# Altium footprint library PcbLib1.PcbLib: 69 footprints (part 1 of 5)
Each footprint in its own frame and in the unit in brackets; x right, y up, seen from the top. Pads: shape width x height; smd on the part's side, far side on the other; paste and mask are expansions set on the pad; w line width, h text height; cw(c..) or ccw(c..) is an arc to the next point about the centre after c.
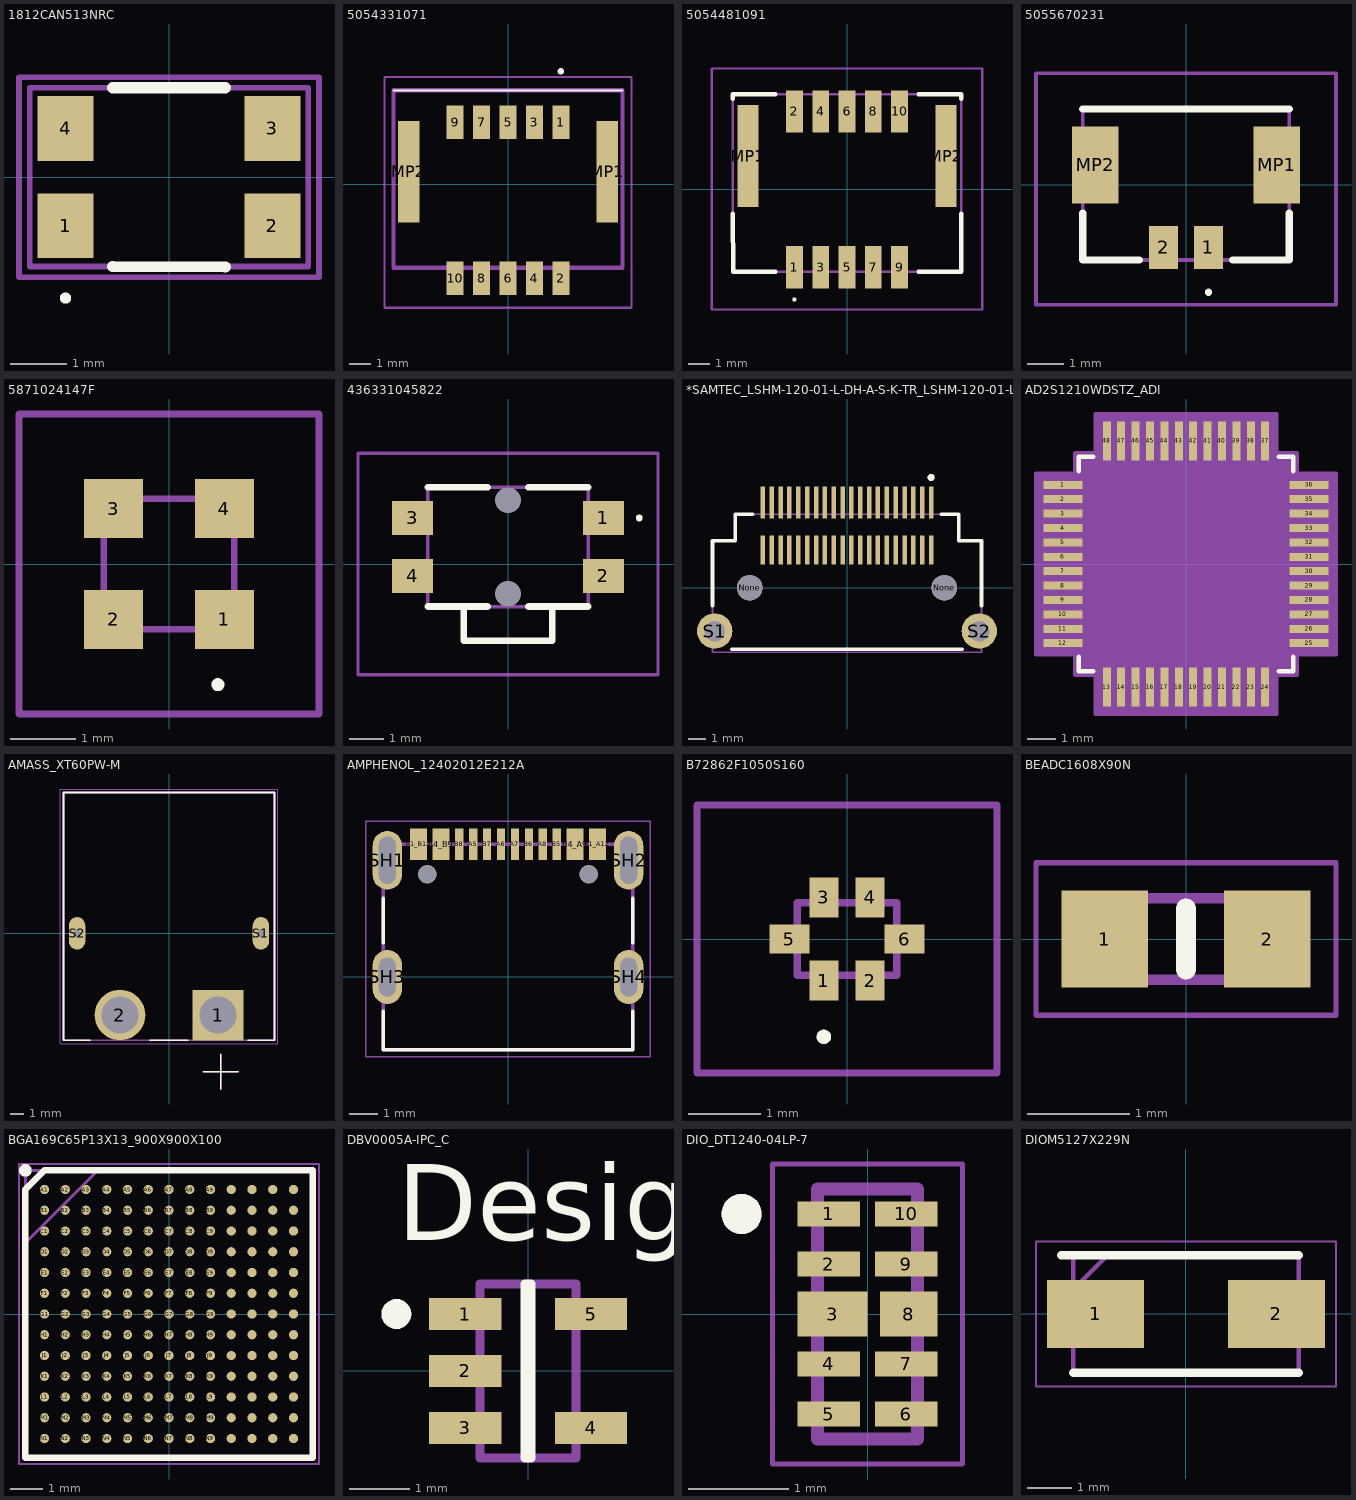
[diagram p0: the footprints below, top view; thin cyan lines are the x and y axes]

## 1812CAN513NRC [mm]
pads (4):
  rect 1x1.15 smd: 1(-1.84,-0.865) 2(1.84,-0.865) 3(1.84,0.865) 4(-1.84,0.865)
Top Overlay:
  lines w0.1: -1.84,-2.2 cw(c-1.84,-2.15) -1.84,-2.1 cw(c-1.84,-2.15) -1.84,-2.2
  lines w0.2: -1,-1.59 1,-1.6 ; -1,1.59 1,1.59
Mechanical 13:
  lines w0.1: -2.475,-1.59 -2.475,1.59 2.475,1.59 2.475,-1.59 -2.475,-1.59
Mechanical 15:
  lines w0.1: -2.667,-1.778 2.667,-1.778 2.667,1.778 -2.667,1.778 -2.667,-1.778
3D body "1812CAN-513NRC.stp": height 3.1, standoff 0, extent -2.475,-1.59 2.475,1.59

## 5054331071 [mm]
pads (12):
  rect 0.8x1.6 smd: 1(2.5,2.94) 2(2.5,-4.45) 3(1.25,2.94) 4(1.25,-4.45) 5(0,2.94) 6(0,-4.45) 7(-1.25,2.94) 8(-1.25,-4.45) 9(-2.5,2.94) 10(-2.5,-4.45)
  rect 1x4.8 smd: MP1(4.7,0.6) MP2(-4.7,0.6)
Top Overlay:
  lines w0.1: -5.425,4.45 5.425,4.45
  lines w0.2: 2.5,5.3 ccw(c2.5,5.35) 2.5,5.4 ; 2.5,5.3 cw(c2.5,5.35) 2.5,5.4 ; 2.5,5.3 ccw(c2.5,5.35) 2.5,5.4
Mechanical 13:
  lines w0.2: -5.425,-3.95 -5.425,4.45 5.425,4.45 5.425,-3.95 -5.425,-3.95
Mechanical 15:
  lines w0.1: -5.842,-5.842 -5.842,5.08 5.842,5.08 5.842,-5.842 -5.842,-5.842
3D body "505433-1071.stp": height 7.25, standoff 0, extent -5.425,-5.48 5.425,3.57

## 5054481091 [mm]
pads (12):
  rect 0.8x2 smd: 1(-2.5,-3.715) 2(-2.5,3.685) 3(-1.25,-3.715) 4(-1.25,3.685) 5(0,-3.715) 6(0,3.685) 7(1.25,-3.715) 8(1.25,3.685) 9(2.5,-3.715) 10(2.5,3.685)
  rect 1x4.85 smd: MP1(-4.7,1.56) MP2(4.7,1.56)
Top Overlay:
  lines w0.1: -2.5,-5.3 ccw(c-2.5,-5.25) -2.5,-5.2 ccw(c-2.5,-5.25) -2.5,-5.3
  lines w0.2: -5.425,-1.175 -5.4,-3.93 -3.4,-3.93 ; -5.425,4.285 -5.425,4.5 -3.4,4.5 ; 3.4,-3.93 5.425,-3.93 5.425,-1.175 ; 3.4,4.5 5.425,4.5 5.425,4.285
Mechanical 13:
  lines w0.1: -5.425,-3.93 5.425,-3.93 5.425,4.5 -5.425,4.5 -5.425,-3.93
Mechanical 15:
  lines w0.1: -6.425,-5.715 6.425,-5.715 6.425,5.715 -6.425,5.715 -6.425,-5.715
3D body "505448-1091.stp": height 8.95, standoff 0, extent -5.425,-4.45 5.425,4.45

## 5055670231 [mm]
pads (4):
  rect 0.8x1.2 smd: 1(0.625,-1.75) 2(-0.625,-1.75)
  rect 1.3x2.15 smd: MP1(2.525,0.545) MP2(-2.525,0.545)
Top Overlay:
  lines w0.1: 0.625,-3.05 ccw(c0.625,-3) 0.625,-2.95 ccw(c0.625,-3) 0.625,-3.05
  lines w0.2: -2.875,-0.8 -2.875,-2.1 -1.3,-2.1 ; -2.875,2.1 2.875,2.1 ; 1.3,-2.1 2.875,-2.1 2.875,-0.8
Mechanical 13:
  lines w0.1: -2.875,-2.1 2.875,-2.1 2.875,2.1 -2.875,2.1 -2.875,-2.1
Mechanical 15:
  lines w0.1: -4.175,-3.35 4.175,-3.35 4.175,3.1 -4.175,3.1 -4.175,-3.35
3D body "505567-0231.stp": height 4.2, standoff 0, extent -2.88,-2.07 2.87,1.83

## 5871024147F [mm]
pads (4):
  rect 0.9x0.9 smd: 1(0.85,-0.85) 2(-0.85,-0.85) 3(-0.85,0.85) 4(0.85,0.85)
Top Overlay:
  lines w0.1: 0.75,-1.9 cw(c0.75,-1.85) 0.75,-1.8 cw(c0.75,-1.85) 0.75,-1.9
Mechanical 13:
  lines w0.1: -1,-1 -1,1 1,1 1,-1 -1,-1
Mechanical 15:
  lines w0.1: -2.3,-2.3 -2.3,2.3 2.3,2.3 2.3,-2.3 -2.3,-2.3
3D body "587-1024-147F.stp": height 1, standoff 0, extent -1,-1 1,1

## 436331045822 [mm]
pads (6):
  rect 1.2x1 smd: 1(2.8,1.35) 2(2.8,-0.35) 3(-2.8,1.35) 4(-2.8,-0.35)
  round 0.375 hole 0.75 unplated: MH1(0,1.875) MH2(0,-0.875)
Top Overlay:
  lines w0.1: 3.8,1.35 cw(c3.85,1.35) 3.9,1.35 cw(c3.85,1.35) 3.8,1.35
  lines w0.2: -2.35,-1.25 -0.6,-1.25 ; -2.35,2.25 -0.6,2.25 ; -1.3,-1.25 -1.3,-2.25 1.3,-2.25 1.3,-1.25 ; 0.6,-1.25 2.35,-1.25 ; 0.6,2.25 2.35,2.25
Mechanical 13:
  lines w0.1: -1.3,-1.25 -1.3,-2.25 1.3,-2.25 1.3,-1.25 ; -2.35,-1.25 -2.35,2.25 2.35,2.25 2.35,-1.25 -2.35,-1.25
Mechanical 15:
  lines w0.1: -4.4,-3.25 -4.4,3.25 4.4,3.25 4.4,-3.25 -4.4,-3.25
3D body "436331045822.stp": height 2.15, standoff 0, extent -3.24,-1.4 3.16,3.1

## *SAMTEC_LSHM-120-01-L-DH-A-S-K-TR_LSHM-120-01-L-DH-A-S-K-TR(Primary) [mm]
pads (44):
  rect 0.254x1.8 smd: 01(4.75,4.81) 03(4.25,4.81) 05(3.75,4.81) 07(3.25,4.81) 09(2.75,4.81) 11(2.25,4.81) 13(1.75,4.81) 15(1.25,4.81) 17(0.75,4.81) 19(0.25,4.81) 21(-0.25,4.81) 23(-0.75,4.81) 25(-1.25,4.81) 27(-1.75,4.81) 29(-2.25,4.81) 31(-2.75,4.81) 33(-3.25,4.81) 35(-3.75,4.81) 37(-4.25,4.81) 39(-4.75,4.81)
  rect 0.254x1.63 smd: 02(4.75,2.135) 04(4.25,2.135) 06(3.75,2.135) 08(3.25,2.135) 10(2.75,2.135) 12(2.25,2.135) 14(1.75,2.135) 16(1.25,2.135) 18(0.75,2.135) 20(0.25,2.135) 22(-0.25,2.135) 24(-0.75,2.135) 26(-1.25,2.135) 28(-1.75,2.135) 30(-2.25,2.135) 32(-2.75,2.135) 34(-3.25,2.135) 36(-3.75,2.135) 38(-4.25,2.135) 40(-4.75,2.135)
  round 1.45 hole 1.45 unplated: None(-5.5,0) None(5.5,0)
  round 2 hole 1.15: S1(-7.475,-2.45) S2(7.475,-2.45)
Top Overlay:
  circle w0.2: c4.75,6.23 r0.1
  lines w0.2: -7.6,-1.03 -7.6,2.65 -6.315,2.65 -6.315,4.15 -5.32,4.15 ; -6.5,-3.47 6.5,-3.47 ; 5.32,4.15 6.315,4.15 6.315,2.65 7.6,2.65 7.6,-1.03
Top Paste:
  circle w1: c7.475,-2.45 r0.5
  circle w1: c-7.475,-2.45 r0.5
Mechanical 4:
  circle w0.2: c4.75,6.23 r0.1
  circle w0.2: c4.75,6.23 r0.1
  lines w0.1: -7.6,-3.65 7.6,-3.65 ; -7.6,-3.65 -7.6,-3.47 ; -7.6,-3.65 7.6,-3.65 ; -7.6,-3.65 -7.6,-3.47 ; -7.6,-3.47 -7.6,2.65 ; -7.6,-3.47 -7.6,2.65 ; -7.6,2.65 -6.315,2.65 ; -7.6,2.65 -6.315,2.65 ; -6.315,2.65 -6.315,4.15 ; -6.315,2.65 -6.315,4.15 ; -6.315,4.15 6.315,4.15 ; -6.315,4.15 6.315,4.15 ; 6.315,2.65 7.6,2.65 ; 6.315,2.65 6.315,4.15 ; 6.315,2.65 7.6,2.65 ; 6.315,2.65 6.315,4.15 ; 7.6,-3.65 7.6,2.65 ; 7.6,-3.65 7.6,2.65
3D body "LSHM-120-01-L-DH-A-S-K-TR.stp": height 5.26, standoff -1.8, extent -7.901,-3.395 7.901,5.604

## AD2S1210WDSTZ_ADI [mm]
pads (48):
  rect 1.361x0.279 smd paste+0 mask+0: 1(-4.275,2.75) 2(-4.275,2.25) 3(-4.275,1.75) 4(-4.275,1.25) 5(-4.275,0.75) 6(-4.275,0.25) 7(-4.275,-0.25) 8(-4.275,-0.75) 9(-4.275,-1.25) 10(-4.275,-1.75) 11(-4.275,-2.25) 12(-4.275,-2.75) 25(4.275,-2.75) 26(4.275,-2.25) 27(4.275,-1.75) 28(4.275,-1.25) 29(4.275,-0.75) 30(4.275,-0.25) 31(4.275,0.25) 32(4.275,0.75) 33(4.275,1.25) 34(4.275,1.75) 35(4.275,2.25) 36(4.275,2.75)
  rect 0.279x1.361 smd paste+0 mask+0: 13(-2.75,-4.275) 14(-2.25,-4.275) 15(-1.75,-4.275) 16(-1.25,-4.275) 17(-0.75,-4.275) 18(-0.25,-4.275) 19(0.25,-4.275) 20(0.75,-4.275) 21(1.25,-4.275) 22(1.75,-4.275) 23(2.25,-4.275) 24(2.75,-4.275) 37(2.75,4.275) 38(2.25,4.275) 39(1.75,4.275) 40(1.25,4.275) 41(0.75,4.275) 42(0.25,4.275) 43(-0.25,4.275) 44(-0.75,4.275) 45(-1.25,4.275) 46(-1.75,4.275) 47(-2.25,4.275) 48(-2.75,4.275)
Top Overlay:
  lines w0.152: -3.721,-3.222 -3.721,-3.721 -3.222,-3.721 ; -3.721,3.222 -3.721,3.721 -3.222,3.721 ; 3.222,-3.721 3.721,-3.721 3.721,-3.222 ; 3.222,3.721 3.721,3.721 3.721,3.222
Mechanical 13:
  drawing of 197 lines, arcs and shapes, not listed
  text "*" at -3.531,2.365 h1.27
Mechanical 15:
  region: -3.144,-3.848 -3.848,-3.848 -3.848,-3.144 -5.21,-3.144 -5.21,3.144 -3.848,3.144 -3.848,3.848 -3.144,3.848 -3.144,5.21 3.144,5.21 3.144,3.848 3.848,3.848 3.848,3.144 5.21,3.144 5.21,-3.144 3.848,-3.144 3.848,-3.848 3.144,-3.848 3.144,-5.21 -3.144,-5.21
  lines w0.152: -5.21,-3.144 -5.21,3.144 -3.848,3.144 -3.848,3.848 -3.144,3.848 -3.144,5.21 3.144,5.21 3.144,3.848 3.848,3.848 3.848,3.144 5.21,3.144 5.21,-3.144 3.848,-3.144 3.848,-3.848 3.144,-3.848 3.144,-5.21 -3.144,-5.21 -3.144,-3.848 -3.848,-3.848 -3.848,-3.144 -5.21,-3.144
3D body "AD2S1210WDSTZ_ADI.step": height 1.6, standoff 0, extent -4.6,-4.6 4.6,4.6

## AMASS_XT60PW-M [mm]
height 8.4
pads (4):
  rect 3.716x3.716 / inner round 3.716 / far side rect 3.716x3.716 hole 2.7: 1(3.6,-6)
  round 3.716 hole 2.7: 2(-3.6,-6)
  oval 1.2x2.4 hole 0.6 square: S1(6.75,0) S2(-6.75,0)
Top Overlay:
  lines w0.127: -5.778,-7.85 -7.75,-7.85 -7.75,10.35 7.75,10.35 7.75,-7.85 5.778,-7.85 ; -1.422,-7.85 1.422,-7.85 ; 2.54,-10.16 3.81,-10.16 ; 3.81,-11.43 3.81,-10.16 ; 3.81,-8.89 3.81,-10.16 ; 5.08,-10.16 3.81,-10.16
Mechanical 13:
  lines w0.127: 2.54,-10.16 3.81,-10.16 ; 3.81,-11.43 3.81,-10.16 ; 3.81,-8.89 3.81,-10.16 ; 5.08,-10.16 3.81,-10.16 ; -7.75,-7.85 7.75,-7.85 7.75,10.35 -7.75,10.35 -7.75,-7.85
Mechanical 15:
  lines w0.05: -8,-8.11 8,-8.11 8,10.6 -8,10.6 -8,-8.11
3D body "step_temp.STEP": height 8.4, standoff -2.55, extent -7.75,-7.85 7.75,10.35

## AMPHENOL_12402012E212A [mm]
height 3.26
pads (18):
  rect 0.6x1.14 smd mask+0.127: A1_B12(-3.2,4.75) A4_B9(-2.4,4.75) B1_A12(3.2,4.75) B4_A9(2.4,4.75)
  rect 0.3x1.14 smd mask+0.127: A5(-1.25,4.75) A6(-0.25,4.75) A7(0.25,4.75) A8(1.25,4.75) B5(1.75,4.75) B6(0.75,4.75) B7(-0.75,4.75) B8(-1.75,4.75)
  oval 1.05x2.1 hole 0.6 slot 1.7 at 90 deg: SH1(-4.32,4.18) SH2(4.32,4.18)
  oval 1.05x1.927 hole 0.6 slot 1.4 at 90 deg: SH3(-4.32,0) SH4(4.32,0)
  round 0.65 hole 0.65 unplated mask+0.127: ""(-2.89,3.68) ""(2.89,3.68)
Top Overlay:
  lines w0.127: -4.47,-1.22 -4.47,-2.6 4.47,-2.6 4.47,-1.22 ; -4.47,1.22 -4.47,2.81 ; 4.47,1.22 4.47,2.81
Top Solder:
  region: 3.81,4.064 -3.81,4.064 -3.81,5.461 3.81,5.461
Mechanical 13:
  lines w0.127: -4.47,-2.6 -4.47,4.75 4.47,4.75 4.47,-2.6 -4.47,-2.6
Mechanical 15:
  lines w0.05: -5.095,-2.85 5.095,-2.85 5.095,5.57 -5.095,5.57 -5.095,-2.85
3D body "step_temp.STEP": height 3.35, standoff -0.81, extent -4.47,-2.647 4.47,4.953

## B72862F1050S160 [mm]
pads (6):
  rect 0.4x0.55 smd: 1(-0.32,-0.575) 2(0.32,-0.575) 3(-0.32,0.575) 4(0.32,0.575)
  rect 0.55x0.4 smd: 5(-0.795,0) 6(0.795,0)
Top Overlay:
  lines w0.1: -0.32,-1.4 cw(c-0.32,-1.35) -0.32,-1.3 cw(c-0.32,-1.35) -0.32,-1.4
Mechanical 13:
  lines w0.1: -0.685,-0.5 -0.685,0.5 0.685,0.5 0.685,-0.5 -0.685,-0.5
Mechanical 15:
  lines w0.1: -2.07,-1.85 -2.07,1.85 2.07,1.85 2.07,-1.85 -2.07,-1.85
3D body "B72862F1050S160.stp": height 0.5, standoff 0, extent -0.603,-0.403 0.603,0.403

## BEADC1608X90N [mm]
pads (2):
  rect 0.85x0.95 smd: 1(-0.8,0) 2(0.8,0)
Top Overlay:
  lines w0.2: 0,-0.3 0,0.3
Mechanical 13:
  lines w0.1: -0.8,-0.4 -0.8,0.4 0.8,0.4 0.8,-0.4 -0.8,-0.4
Mechanical 15:
  lines w0.05: -1.475,-0.75 -1.475,0.75 1.475,0.75 1.475,-0.75 -1.475,-0.75
3D body "FBMH1608HM601-T.stp": height 0.9, standoff 0, extent -0.8,-0.4 0.8,0.4

## BGA169C65P13X13_900X900X100 [mm]
pads (169):
  round 0.29 smd: A1(-3.9,3.9) A2(-3.25,3.9) A3(-2.6,3.9) A4(-1.95,3.9) A5(-1.3,3.9) A6(-0.65,3.9) A7(0,3.9) A8(0.65,3.9) A9(1.3,3.9) A10(1.95,3.9) A11(2.6,3.9) A12(3.25,3.9) A13(3.9,3.9) B1(-3.9,3.25) B2(-3.25,3.25) B3(-2.6,3.25) B4(-1.95,3.25) B5(-1.3,3.25) B6(-0.65,3.25) B7(0,3.25) B8(0.65,3.25) B9(1.3,3.25) B10(1.95,3.25) B11(2.6,3.25) B12(3.25,3.25) B13(3.9,3.25) C1(-3.9,2.6) C2(-3.25,2.6) C3(-2.6,2.6) C4(-1.95,2.6) C5(-1.3,2.6) C6(-0.65,2.6) C7(0,2.6) C8(0.65,2.6) C9(1.3,2.6) C10(1.95,2.6) C11(2.6,2.6) C12(3.25,2.6) C13(3.9,2.6) D1(-3.9,1.95) D2(-3.25,1.95) D3(-2.6,1.95) D4(-1.95,1.95) D5(-1.3,1.95) D6(-0.65,1.95) D7(0,1.95) D8(0.65,1.95) D9(1.3,1.95) D10(1.95,1.95) D11(2.6,1.95) D12(3.25,1.95) D13(3.9,1.95) E1(-3.9,1.3) E2(-3.25,1.3) E3(-2.6,1.3) E4(-1.95,1.3) E5(-1.3,1.3) E6(-0.65,1.3) E7(0,1.3) E8(0.65,1.3) E9(1.3,1.3) E10(1.95,1.3) E11(2.6,1.3) E12(3.25,1.3) E13(3.9,1.3) F1(-3.9,0.65) F2(-3.25,0.65) F3(-2.6,0.65) F4(-1.95,0.65) F5(-1.3,0.65) F6(-0.65,0.65) F7(0,0.65) F8(0.65,0.65) F9(1.3,0.65) F10(1.95,0.65) F11(2.6,0.65) F12(3.25,0.65) F13(3.9,0.65) G1(-3.9,0) G2(-3.25,0) G3(-2.6,0) G4(-1.95,0) G5(-1.3,0) G6(-0.65,0) G7(0,0) G8(0.65,0) G9(1.3,0) G10(1.95,0) G11(2.6,0) G12(3.25,0) G13(3.9,0) H1(-3.9,-0.65) H2(-3.25,-0.65) H3(-2.6,-0.65) H4(-1.95,-0.65) H5(-1.3,-0.65) H6(-0.65,-0.65) H7(0,-0.65) H8(0.65,-0.65) H9(1.3,-0.65) H10(1.95,-0.65) H11(2.6,-0.65) H12(3.25,-0.65) H13(3.9,-0.65) J1(-3.9,-1.3) J2(-3.25,-1.3) J3(-2.6,-1.3) J4(-1.95,-1.3) J5(-1.3,-1.3) J6(-0.65,-1.3) J7(0,-1.3) J8(0.65,-1.3) J9(1.3,-1.3) J10(1.95,-1.3) J11(2.6,-1.3) J12(3.25,-1.3) J13(3.9,-1.3) K1(-3.9,-1.95) K2(-3.25,-1.95) K3(-2.6,-1.95) K4(-1.95,-1.95) K5(-1.3,-1.95) K6(-0.65,-1.95) K7(0,-1.95) K8(0.65,-1.95) K9(1.3,-1.95) K10(1.95,-1.95) K11(2.6,-1.95) K12(3.25,-1.95) K13(3.9,-1.95) L1(-3.9,-2.6) L2(-3.25,-2.6) L3(-2.6,-2.6) L4(-1.95,-2.6) L5(-1.3,-2.6) L6(-0.65,-2.6) L7(0,-2.6) L8(0.65,-2.6) L9(1.3,-2.6) L10(1.95,-2.6) L11(2.6,-2.6) L12(3.25,-2.6) L13(3.9,-2.6) M1(-3.9,-3.25) M2(-3.25,-3.25) M3(-2.6,-3.25) M4(-1.95,-3.25) M5(-1.3,-3.25) M6(-0.65,-3.25) M7(0,-3.25) M8(0.65,-3.25) M9(1.3,-3.25) M10(1.95,-3.25) M11(2.6,-3.25) M12(3.25,-3.25) M13(3.9,-3.25) N1(-3.9,-3.9) N2(-3.25,-3.9) N3(-2.6,-3.9) N4(-1.95,-3.9) N5(-1.3,-3.9) N6(-0.65,-3.9) N7(0,-3.9) N8(0.65,-3.9) N9(1.3,-3.9) N10(1.95,-3.9) N11(2.6,-3.9) N12(3.25,-3.9) N13(3.9,-3.9)
Top Overlay:
  circle w0.2: c-4.5,4.5 r0.1
  lines w0.2: -4.5,-4.5 4.5,-4.5 4.5,4.5 -3.9,4.5 -4.5,3.9 -4.5,-4.5
Mechanical 13:
  lines w0.1: -4.5,2.225 -2.225,4.5 ; -4.5,-4.5 4.5,-4.5 4.5,4.5 -4.5,4.5 -4.5,-4.5
Mechanical 15:
  lines w0.05: -4.699,-4.699 -4.699,4.699 4.699,4.699 4.699,-4.699 -4.699,-4.699
3D body "F28P650DK9NMRR.stp": height 1, standoff 0, extent -4.5,-4.5 4.5,4.5

## DBV0005A-IPC_C [mm]
pads (5):
  rect 1.205x0.532 smd paste+0 mask+0: 1(-1.05,0.95) 2(-1.05,0) 3(-1.05,-0.95) 4(1.05,-0.95) 5(1.05,0.95)
Top Overlay:
  circle w0.25: c-2.2,0.95 r0.125
  lines w0.15: -0.052,-1.45 -0.052,1.45 0.052,1.45 0.052,-1.45 -0.052,-1.45
  text "Designator910" at -2.184,2.184 h1.27
Mechanical 13:
  lines w0.15: -0.8,-1.45 0.8,-1.45 0.8,1.45 -0.8,1.45 -0.8,-1.45

## DIO_DT1240-04LP-7 [mm]
pads (10):
  rect 0.625x0.25 smd mask+0.05: 1(-0.387,1) 2(-0.387,0.5) 4(-0.387,-0.5) 5(-0.387,-1) 6(0.387,-1) 7(0.387,-0.5) 9(0.387,0.5) 10(0.387,1)
  rect 0.7x0.45 smd mask+0.05: 3(-0.35,0)
  rect 0.575x0.45 smd mask+0.05: 8(0.413,0)
Top Overlay:
  circle w0.2: c-1.261,1 r0.1
Mechanical 13:
  circle w0.2: c-1.261,1 r0.1
  lines w0.127: -0.5,-1.25 -0.5,1.25 0.5,1.25 0.5,-1.25 -0.5,-1.25
Mechanical 15:
  lines w0.05: -0.95,-1.5 0.95,-1.5 0.95,1.5 -0.95,1.5 -0.95,-1.5
3D body "D3V3X4U10LP-7.STEP": height 0.61, standoff 0, extent -0.5,-1.25 0.5,1.25

## DIOM5127X229N [mm]
pads (2):
  rect 2.2x1.55 smd: 1(-2.05,0) 2(2.05,0)
Top Overlay:
  lines w0.2: -2.825,1.332 2.552,1.332 ; -2.552,-1.332 2.552,-1.332
Mechanical 13:
  lines w0.1: -2.552,0.558 -1.778,1.332 ; -2.552,-1.332 -2.552,1.332 2.552,1.332 2.552,-1.332 -2.552,-1.332
Mechanical 15:
  lines w0.05: -3.4,-1.645 -3.4,1.645 3.4,1.645 3.4,-1.645 -3.4,-1.645
3D body "SMAJ12A.stp": height 2.29, standoff 0, extent -2.552,-1.332 2.552,1.332